# Altium footprint library Cty1.PcbLib: 1378 footprints (part 82 of 87)
Each footprint in its own frame and in the unit in brackets; x right, y up, seen from the top. Pads: shape width x height; smd on the part's side, far side on the other; paste and mask are expansions set on the pad; w line width, h text height; cw(c..) or ccw(c..) is an arc to the next point about the centre after c.
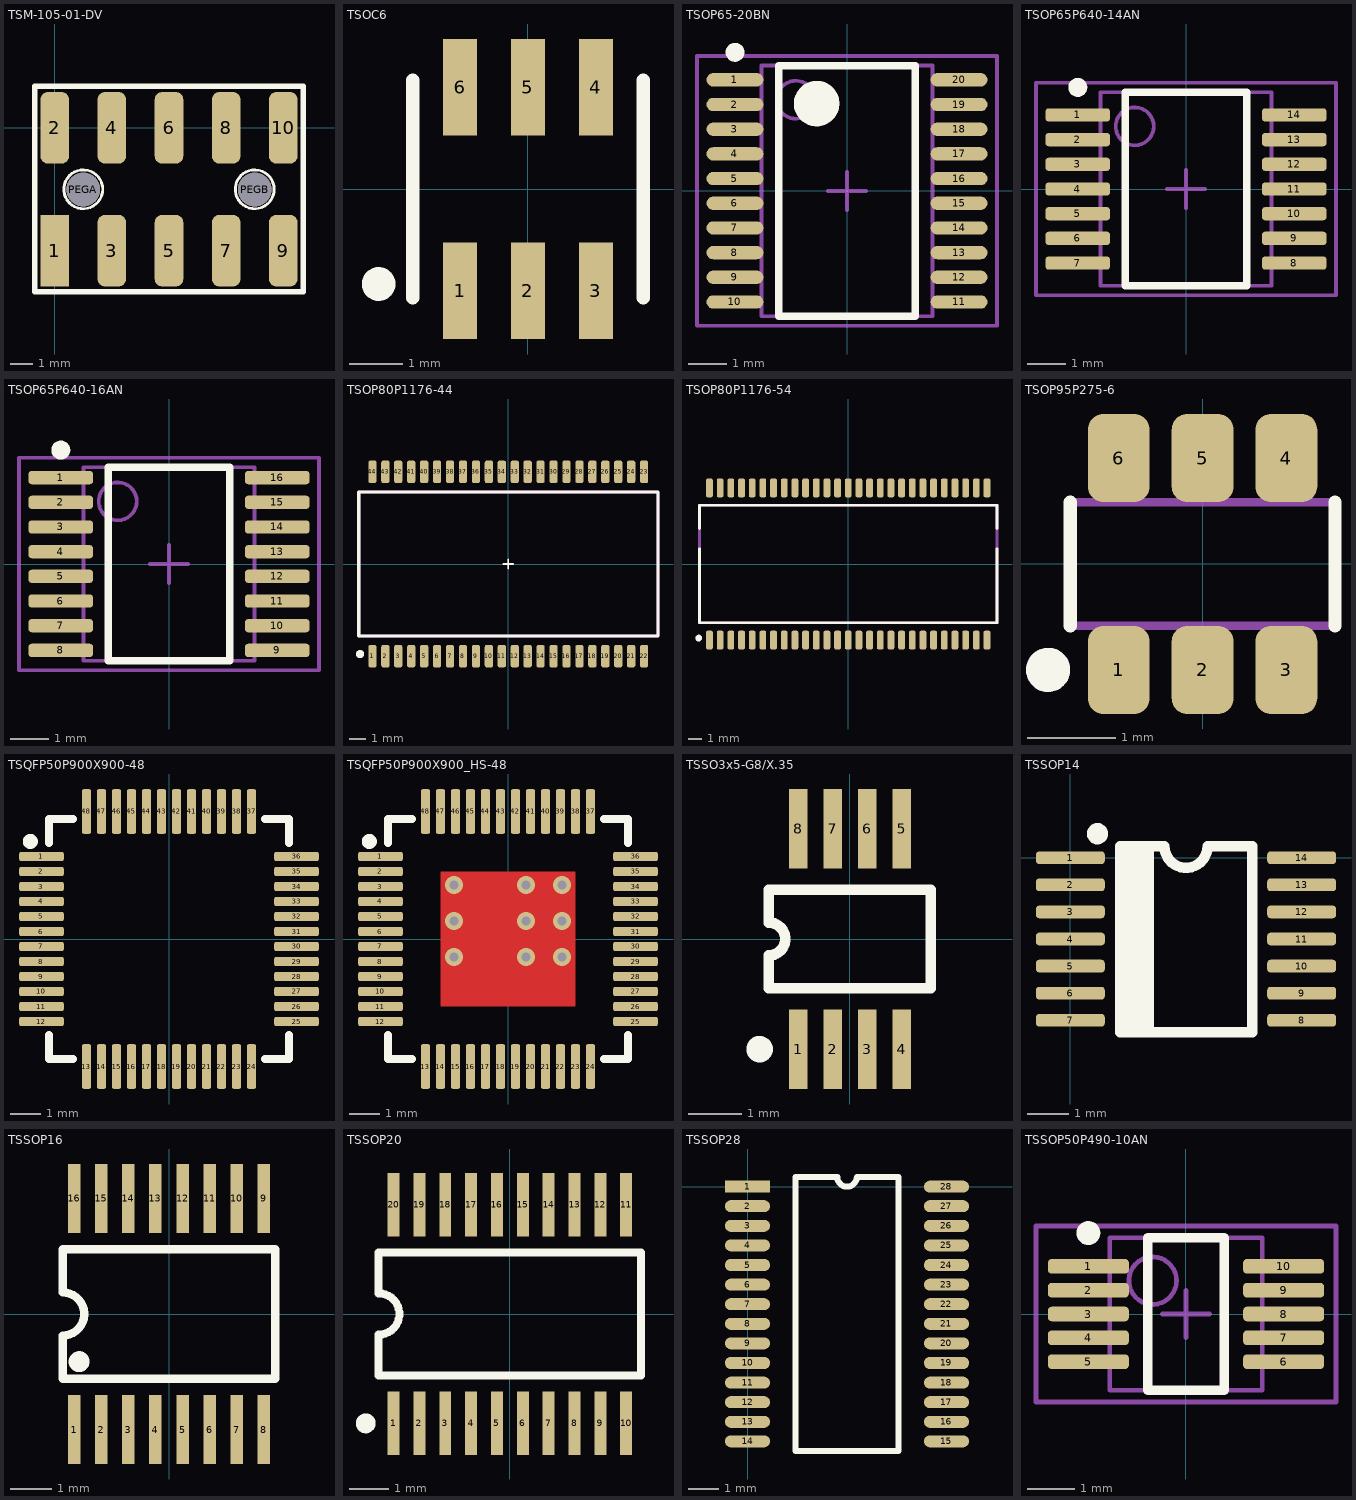
[diagram p81: the footprints below, top view; thin cyan lines are the x and y axes]

## TSM-105-01-DV [mil]
pads (12):
  rect 50x125 smd: 1(0,-215)
  rrect50% 50x125 smd: 2(0,0) 3(100,-215) 4(100,0) 5(200,-215) 6(200,0) 7(300,-215) 8(300,0) 9(400,-215) 10(400,0)
  round 59.05 hole 59.06 unplated mask+1.5: PEGA(50,-108) PEGB(350,-108)
Top Overlay:
  circle w5: c350,-107.52 r34.06
  circle w5: c50,-107.52 r34.06
  lines w10: -35,-287 -35,73 435,73 435,-287 -35,-287
3D body "TSM-105-01-X-DV-A.STEP": height 10, standoff 0, extent -52.1,-253.2 447.9,36.8

## TSOC6 [mil]
pads (6):
  rect 25x71 smd mask+1.5: 1(-50,-75) 2(0,-75) 3(50,-75) 4(50,75) 5(0,75) 6(-50,75)
Top Overlay:
  circle w15: c-110,-70 r4.92
  lines w10: -85,-80 -85,80 ; 85,-80 85,80
3D body: height 19.68, standoff 0, extent -61.81,-88.29 -37.83,-34.19
3D body: height 19.68, standoff 0, extent -11.81,-88.07 12.17,-33.98
3D body: height 19.68, standoff 0, extent 38.58,-89.57 62.56,-35.47
3D body: height 19.68, standoff 0, extent -62.95,35.47 -38.98,89.57
3D body: height 19.68, standoff 0, extent -12.17,36.93 11.81,91.02
3D body: height 19.68, standoff 0, extent 37.05,36.93 61.02,91.02
3D body: height 39.37, standoff 0, extent -79.43,-64.96 83.84,72.83
3D body: height 40, standoff 0, extent -62.54,-34.61 -40.14,-12.2

## TSOP65-20BN [mm] "TSOP, 20-Leads, Body 6.5x4.4mm, Pitch 0.65mm, IPC Medium Density"
height 1.2
pads (20):
  oval 1.5x0.35 smd: 1(-2.95,2.925) 2(-2.95,2.275) 3(-2.95,1.625) 4(-2.95,0.975) 5(-2.95,0.325) 6(-2.95,-0.325) 7(-2.95,-0.975) 8(-2.95,-1.625) 9(-2.95,-2.275) 10(-2.95,-2.925) 11(2.95,-2.925) 12(2.95,-2.275) 13(2.95,-1.625) 14(2.95,-0.975) 15(2.95,-0.325) 16(2.95,0.325) 17(2.95,0.975) 18(2.95,1.625) 19(2.95,2.275) 20(2.95,2.925)
Top Overlay:
  circle w0.25: c-2.95,3.65 r0.125
  circle w0.6: c-0.8,2.3 r0.3
  lines w0.2: -1.8,-3.3 -1.8,3.3 1.8,3.3 1.8,-3.3 -1.8,-3.3
Mechanical 13:
  circle w0.1: c-1.35,2.4 r0.5
  lines w0.1: -2.25,-3.3 -2.25,3.3 2.25,3.3 2.25,-3.3 -2.25,-3.3
Mechanical 15:
  lines w0.1: -0.5,0 0.5,0 ; 0,-0.5 0,0.5 ; -3.95,-3.55 -3.95,3.55 3.95,3.55 3.95,-3.55 -3.95,-3.55
3D body: height 1.2, standoff 0, extent -2.25,-3.3 2.25,3.3

## TSOP65P640-14AN [mm]
pads (14):
  rrect50% 1.7x0.35 smd: 1(-2.85,1.95) 2(-2.85,1.3) 3(-2.85,0.65) 4(-2.85,0) 5(-2.85,-0.65) 6(-2.85,-1.3) 7(-2.85,-1.95) 8(2.85,-1.95) 9(2.85,-1.3) 10(2.85,-0.65) 11(2.85,0) 12(2.85,0.65) 13(2.85,1.3) 14(2.85,1.95)
Top Overlay:
  circle w0.25: c-2.85,2.675 r0.125
  lines w0.2: -1.6,-2.55 1.6,-2.55 1.6,2.55 -1.6,2.55 -1.6,-2.55
Mechanical 13:
  circle w0.1: c-1.35,1.65 r0.5
  lines w0.1: -2.25,-2.55 -2.25,2.55 2.25,2.55 2.25,-2.55 -2.25,-2.55
Mechanical 15:
  lines w0.1: -0.5,0 0.5,0 ; 0,-0.5 0,0.5 ; -3.95,-2.8 -3.95,2.8 3.95,2.8 3.95,-2.8 -3.95,-2.8
3D body: height 0.64, standoff 0, extent -2.062,-2.535 1.925,2.469
3D body: height 0.13, standoff 0, extent 2.657,1.865 3.343,2.042
3D body: height 0.25, standoff 0.13, extent 1.984,1.865 2.721,2.042
3D body: height 0.13, standoff 0, extent 2.632,1.204 3.318,1.382
3D body: height 0.25, standoff 0.13, extent 1.959,1.204 2.696,1.382
3D body: height 0.13, standoff 0, extent 2.632,0.544 3.318,0.722
3D body: height 0.25, standoff 0.13, extent 1.934,0.544 2.67,0.722
3D body: height 0.13, standoff 0, extent 2.607,-0.091 3.292,0.087
3D body: height 0.25, standoff 0.13, extent 1.934,-0.091 2.67,0.087
3D body: height 0.25, standoff 0.13, extent 1.934,-0.701 2.67,-0.523
3D body: height 0.13, standoff 0, extent 2.607,-0.701 3.292,-0.523
3D body: height 0.25, standoff 0.13, extent 1.883,-1.336 2.619,-1.158
3D body: height 0.13, standoff 0, extent 2.556,-1.336 3.242,-1.158
3D body: height 0.25, standoff 0.13, extent 1.908,-1.971 2.645,-1.793
3D body: height 0.13, standoff 0, extent 2.581,-1.971 3.267,-1.793
3D body: height 0.25, standoff 0.13, extent -2.38,1.847 -1.643,2.024
3D body: height 0.13, standoff 0, extent -3.002,1.847 -2.316,2.024
3D body: height 0.25, standoff 0.13, extent -2.38,1.212 -1.643,1.389
3D body: height 0.13, standoff 0, extent -3.002,1.212 -2.316,1.389
3D body: height 0.25, standoff 0.13, extent -2.431,0.551 -1.694,0.729
3D body: height 0.13, standoff 0, extent -3.053,0.551 -2.367,0.729
3D body: height 0.25, standoff 0.13, extent -2.431,-0.084 -1.694,0.094
3D body: height 0.13, standoff 0, extent -3.053,-0.084 -2.367,0.094
3D body: height 0.25, standoff 0.13, extent -2.431,-0.719 -1.694,-0.541
3D body: height 0.13, standoff 0, extent -3.053,-0.719 -2.367,-0.541
3D body: height 0.25, standoff 0.13, extent -2.431,-1.354 -1.694,-1.176
3D body: height 0.13, standoff 0, extent -3.053,-1.354 -2.367,-1.176
3D body: height 0.25, standoff 0.13, extent -2.431,-2.014 -1.694,-1.836
3D body: height 0.13, standoff 0, extent -3.053,-2.014 -2.367,-1.836

## TSOP65P640-16AN [mm]
pads (16):
  rrect50% 1.7x0.35 smd: 1(-2.85,2.275) 2(-2.85,1.625) 3(-2.85,0.975) 4(-2.85,0.325) 5(-2.85,-0.325) 6(-2.85,-0.975) 7(-2.85,-1.625) 8(-2.85,-2.275) 9(2.85,-2.275) 10(2.85,-1.625) 11(2.85,-0.975) 12(2.85,-0.325) 13(2.85,0.325) 14(2.85,0.975) 15(2.85,1.625) 16(2.85,2.275)
Top Overlay:
  circle w0.25: c-2.85,3 r0.125
  lines w0.2: -1.6,-2.55 1.6,-2.55 1.6,2.55 -1.6,2.55 -1.6,-2.55
Mechanical 13:
  circle w0.1: c-1.35,1.65 r0.5
  lines w0.1: -2.25,-2.55 2.25,-2.55 2.25,2.55 -2.25,2.55 -2.25,-2.55
Mechanical 15:
  lines w0.1: -0.5,0 0.5,0 ; 0,-0.5 0,0.5 ; -3.95,-2.8 3.95,-2.8 3.95,2.8 -3.95,2.8 -3.95,-2.8
3D body: height 0.25, standoff 0.13, extent 1.934,-2.377 2.67,-2.199
3D body: height 0.13, standoff 0, extent 2.607,-2.377 3.292,-2.199
3D body: height 0.25, standoff 0.13, extent 1.959,-1.717 2.696,-1.539
3D body: height 0.13, standoff 0, extent 2.632,-1.717 3.318,-1.539
3D body: height 0.64, standoff 0, extent -2.037,-2.23 1.951,2.774
3D body: height 0.13, standoff 0, extent 2.683,2.169 3.369,2.347
3D body: height 0.25, standoff 0.13, extent 2.01,2.169 2.746,2.347
3D body: height 0.13, standoff 0, extent 2.657,1.509 3.343,1.687
3D body: height 0.25, standoff 0.13, extent 1.984,1.509 2.721,1.687
3D body: height 0.13, standoff 0, extent 2.657,0.849 3.343,1.026
3D body: height 0.25, standoff 0.13, extent 1.959,0.849 2.696,1.026
3D body: height 0.13, standoff 0, extent 2.632,0.214 3.318,0.391
3D body: height 0.25, standoff 0.13, extent 1.959,0.214 2.696,0.391
3D body: height 0.25, standoff 0.13, extent 1.959,-0.396 2.696,-0.218
3D body: height 0.13, standoff 0, extent 2.632,-0.396 3.318,-0.218
3D body: height 0.25, standoff 0.13, extent 1.908,-1.031 2.645,-0.853
3D body: height 0.13, standoff 0, extent 2.581,-1.031 3.267,-0.853
3D body: height 0.25, standoff 0.13, extent 1.934,-1.666 2.67,-1.488
3D body: height 0.13, standoff 0, extent 2.607,-1.666 3.292,-1.488
3D body: height 0.13, standoff 0, extent -3.226,1.473 -2.54,1.651
3D body: height 0.25, standoff 0.13, extent -2.603,1.473 -1.867,1.651
3D body: height 0.13, standoff 0, extent -3.2,0.838 -2.515,1.016
3D body: height 0.25, standoff 0.13, extent -2.578,0.838 -1.841,1.016
3D body: height 0.13, standoff 0, extent -3.251,0.203 -2.565,0.381
3D body: height 0.25, standoff 0.13, extent -2.629,0.203 -1.892,0.381
3D body: height 0.25, standoff 0.13, extent -2.629,-0.406 -1.892,-0.229
3D body: height 0.13, standoff 0, extent -3.251,-0.406 -2.565,-0.229
3D body: height 0.25, standoff 0.13, extent -2.629,-1.041 -1.892,-0.864
3D body: height 0.13, standoff 0, extent -3.277,-1.041 -2.591,-0.864
3D body: height 0.25, standoff 0.13, extent -2.654,-1.702 -1.918,-1.524
3D body: height 0.13, standoff 0, extent -3.277,-1.702 -2.591,-1.524
3D body: height 0.25, standoff 0.13, extent -2.68,-2.362 -1.943,-2.184
3D body: height 0.13, standoff 0, extent -3.302,-2.362 -2.616,-2.184
3D body: height 0.13, standoff 0, extent -3.251,1.524 -2.565,1.702
3D body: height 0.25, standoff 0.13, extent -2.629,1.524 -1.892,1.702
3D body: height 0.13, standoff 0, extent -3.226,2.184 -2.54,2.362
3D body: height 0.25, standoff 0.13, extent -2.603,2.184 -1.867,2.362

## TSOP80P1176-44 [mm]
pads (44):
  rrect50% 0.508x1.4 smd: 1(-8.4,-5.7) 2(-7.6,-5.7) 3(-6.8,-5.7) 4(-6,-5.7) 5(-5.2,-5.7) 6(-4.4,-5.7) 7(-3.6,-5.7) 8(-2.8,-5.7) 9(-2,-5.7) 10(-1.2,-5.7) 11(-0.4,-5.7) 12(0.4,-5.7) 13(1.2,-5.7) 14(2,-5.7) 15(2.8,-5.7) 16(3.6,-5.7) 17(4.4,-5.7) 18(5.2,-5.7) 19(6,-5.7) 20(6.8,-5.7) 21(7.6,-5.7) 22(8.4,-5.7) 23(8.4,5.7) 24(7.6,5.7) 25(6.8,5.7) 26(6,5.7) 27(5.2,5.7) 28(4.4,5.7) 29(3.6,5.7) 30(2.8,5.7) 31(2,5.7) 32(1.2,5.7) 33(0.4,5.7) 34(-0.4,5.7) 35(-1.2,5.7) 36(-2,5.7) 37(-2.8,5.7) 38(-3.6,5.7) 39(-4.4,5.7) 40(-5.2,5.7) 41(-6,5.7) 42(-6.8,5.7) 43(-7.6,5.7) 44(-8.4,5.7)
Top Overlay:
  circle w0.25: c-9.166,-5.577 r0.125
  lines w0.1: -0.3,0 0.3,0 ; 0,-0.3 0,0.3
  lines w0.2: -9.241,-4.452 9.259,-4.452 9.259,4.448 -9.241,4.448 -9.241,-0.637 -9.241,-4.452
Mechanical 7:
  circle w0.25: c-9.166,-5.577 r0.125
  lines w0.1: -0.3,0 0.3,0 ; 0,-0.3 0,0.3
  lines w0.2: -9.241,-4.452 -9.241,-0.637 -9.241,4.448 9.259,4.448 9.259,-4.452 -9.241,-4.452
  text ".Comment" at -8.813,2.33 h1.2
  text ".Designator" at -8.813,3.33 h1.2
3D body: height 0.3, standoff 0, extent -8.731,-5.936 -8.118,-4.493
3D body: height 0.3, standoff 0, extent -7.888,-5.947 -7.274,-4.504
3D body: height 0.3, standoff 0, extent -7.134,-5.925 -6.52,-4.482
3D body: height 0.3, standoff 0, extent -6.337,-5.925 -5.723,-4.482
3D body: height 0.3, standoff 0, extent -5.518,-5.947 -4.905,-4.504
3D body: height 0.3, standoff 0, extent -4.743,-5.947 -4.129,-4.504
3D body: height 0.3, standoff 0, extent -3.924,-5.947 -3.311,-4.504
3D body: height 0.3, standoff 0, extent -3.148,-5.947 -2.535,-4.504
3D body: height 0.3, standoff 0, extent -2.351,-5.947 -1.738,-4.504
3D body: height 0.3, standoff 0, extent -1.511,-5.947 -0.898,-4.504
3D body: height 0.3, standoff 0, extent -0.714,-5.947 -0.101,-4.504
3D body: height 0.3, standoff 0, extent 0.061,-5.947 0.675,-4.504
3D body: height 0.3, standoff 0, extent 0.902,-5.947 1.515,-4.504
3D body: height 0.3, standoff 0, extent 1.677,-5.925 2.29,-4.482
3D body: height 0.3, standoff 0, extent 2.453,-5.925 3.066,-4.482
3D body: height 0.3, standoff 0, extent 3.293,-5.925 3.906,-4.482
3D body: height 0.3, standoff 0, extent 4.09,-5.925 4.703,-4.482
3D body: height 0.3, standoff 0, extent 4.887,-5.925 5.5,-4.482
3D body: height 0.3, standoff 0, extent 5.684,-5.904 6.297,-4.461
3D body: height 0.3, standoff 0, extent 6.438,-5.904 7.051,-4.461
3D body: height 0.3, standoff 0, extent 7.257,-5.882 7.87,-4.439
3D body: height 0.3, standoff 0, extent 8.075,-5.904 8.688,-4.461
3D body: height 0.3, standoff 0, extent 8.14,4.372 8.753,5.815
3D body: height 0.3, standoff 0, extent 7.321,4.393 7.934,5.836
3D body: height 0.3, standoff 0, extent 6.503,4.372 7.116,5.815
3D body: height 0.3, standoff 0, extent 5.749,4.372 6.362,5.815
3D body: height 0.3, standoff 0, extent 4.951,4.35 5.565,5.793
3D body: height 0.3, standoff 0, extent 4.154,4.35 4.768,5.793
3D body: height 0.3, standoff 0, extent 3.357,4.35 3.971,5.793
3D body: height 0.3, standoff 0, extent 2.517,4.35 3.13,5.793
3D body: height 0.3, standoff 0, extent 1.742,4.35 2.355,5.793
3D body: height 0.3, standoff 0, extent 0.966,4.329 1.579,5.772
3D body: height 0.3, standoff 0, extent 0.126,4.329 0.739,5.772
3D body: height 0.3, standoff 0, extent -0.649,4.329 -0.036,5.772
3D body: height 0.3, standoff 0, extent -1.447,4.329 -0.833,5.772
3D body: height 0.3, standoff 0, extent -2.287,4.329 -1.673,5.772
3D body: height 0.3, standoff 0, extent -3.084,4.329 -2.47,5.772
3D body: height 0.3, standoff 0, extent -3.859,4.329 -3.246,5.772
3D body: height 0.3, standoff 0, extent -4.678,4.329 -4.065,5.772
3D body: height 0.3, standoff 0, extent -5.453,4.329 -4.84,5.772
3D body: height 0.3, standoff 0, extent -6.272,4.35 -5.659,5.793
3D body: height 0.3, standoff 0, extent -7.069,4.35 -6.456,5.793
3D body: height 0.3, standoff 0, extent -7.823,4.329 -7.21,5.772
3D body: height 0.3, standoff 0, extent -8.666,4.34 -8.053,5.783
3D body: height 1, standoff 0, extent -9.244,-4.542 9.262,4.404

## TSOP80P1176-54 [mm]
pads (54):
  rrect50% 0.508x1.4 smd: 1(-10.4,-5.7) 2(-9.6,-5.7) 3(-8.8,-5.7) 4(-8,-5.7) 5(-7.2,-5.7) 6(-6.4,-5.7) 7(-5.6,-5.7) 8(-4.8,-5.7) 9(-4,-5.7) 10(-3.2,-5.7) 11(-2.4,-5.7) 12(-1.6,-5.7) 13(-0.8,-5.7) 14(0,-5.7) 15(0.8,-5.7) 16(1.6,-5.7) 17(2.4,-5.7) 18(3.2,-5.7) 19(4,-5.7) 20(4.8,-5.7) 21(5.6,-5.7) 22(6.4,-5.7) 23(7.2,-5.7) 24(8,-5.7) 25(8.8,-5.7) 26(9.6,-5.7) 27(10.4,-5.7) 28(10.4,5.7) 29(9.6,5.7) 30(8.8,5.7) 31(8,5.7) 32(7.2,5.7) 33(6.4,5.7) 34(5.6,5.7) 35(4.8,5.7) 36(4,5.7) 37(3.2,5.7) 38(2.4,5.7) 39(1.6,5.7) 40(0.8,5.7) 41(0,5.7) 42(-0.8,5.7) 43(-1.6,5.7) 44(-2.4,5.7) 45(-3.2,5.7) 46(-4,5.7) 47(-4.8,5.7) 48(-5.6,5.7) 49(-6.4,5.7) 50(-7.2,5.7) 51(-8,5.7) 52(-8.8,5.7) 53(-9.6,5.7) 54(-10.4,5.7)
Top Overlay:
  circle w0.25: c-11.21,-5.55 r0.125
  lines w0.2: -11.15,1.147 -11.15,-0.635 -11.15,-4.4 11.15,-4.4 11.15,1.147 ; -11.15,2.658 -11.15,4.4 11.15,4.4 11.15,2.658
Mechanical 7:
  circle w0.25: c-11.21,-5.55 r0.125
  lines w0.2: -11.15,-4.4 11.15,-4.4 11.15,4.4 -11.15,4.4 -11.15,-0.635 -11.15,-4.4
  text ".Comment" at -10.591,2.076 h1.2
  text ".Designator" at -10.591,3.076 h1.2
3D body: height 0.3, standoff 0, extent -6.684,-5.95 -6.071,-4.507
3D body: height 0.3, standoff 0, extent -5.841,-5.961 -5.228,-4.518
3D body: height 0.3, standoff 0, extent -5.087,-5.939 -4.474,-4.497
3D body: height 0.3, standoff 0, extent -4.29,-5.939 -3.677,-4.497
3D body: height 0.3, standoff 0, extent -3.471,-5.961 -2.858,-4.518
3D body: height 0.3, standoff 0, extent -2.696,-5.961 -2.082,-4.518
3D body: height 0.3, standoff 0, extent -1.877,-5.961 -1.264,-4.518
3D body: height 0.3, standoff 0, extent -1.102,-5.961 -0.488,-4.518
3D body: height 0.3, standoff 0, extent -0.305,-5.961 0.309,-4.518
3D body: height 0.3, standoff 0, extent 0.536,-5.961 1.149,-4.518
3D body: height 0.3, standoff 0, extent 1.333,-5.961 1.946,-4.518
3D body: height 0.3, standoff 0, extent 2.108,-5.961 2.721,-4.518
3D body: height 0.3, standoff 0, extent 2.948,-5.961 3.562,-4.518
3D body: height 0.3, standoff 0, extent 3.724,-5.939 4.337,-4.497
3D body: height 0.3, standoff 0, extent 4.499,-5.939 5.113,-4.497
3D body: height 0.3, standoff 0, extent 5.339,-5.939 5.953,-4.497
3D body: height 0.3, standoff 0, extent 6.137,-5.939 6.75,-4.497
3D body: height 0.3, standoff 0, extent 6.934,-5.939 7.547,-4.497
3D body: height 0.3, standoff 0, extent 7.731,-5.918 8.344,-4.475
3D body: height 0.3, standoff 0, extent 8.485,-5.918 9.098,-4.475
3D body: height 0.3, standoff 0, extent 9.303,-5.896 9.917,-4.453
3D body: height 0.3, standoff 0, extent 10.122,-5.918 10.735,-4.475
3D body: height 0.3, standoff 0, extent -6.684,4.47 -6.071,5.913
3D body: height 0.3, standoff 0, extent -5.841,4.459 -5.228,5.902
3D body: height 0.3, standoff 0, extent -5.087,4.48 -4.474,5.923
3D body: height 0.3, standoff 0, extent -4.29,4.48 -3.677,5.923
3D body: height 0.3, standoff 0, extent -3.471,4.459 -2.858,5.902
3D body: height 0.3, standoff 0, extent -2.696,4.459 -2.082,5.902
3D body: height 0.3, standoff 0, extent -1.877,4.459 -1.264,5.902
3D body: height 0.3, standoff 0, extent -1.102,4.459 -0.488,5.902
3D body: height 0.3, standoff 0, extent -0.305,4.459 0.309,5.902
3D body: height 0.3, standoff 0, extent 0.536,4.459 1.149,5.902
3D body: height 0.3, standoff 0, extent 1.333,4.459 1.946,5.902
3D body: height 0.3, standoff 0, extent 2.108,4.459 2.721,5.902
3D body: height 0.3, standoff 0, extent 2.948,4.459 3.562,5.902
3D body: height 0.3, standoff 0, extent 3.724,4.48 4.337,5.923
3D body: height 0.3, standoff 0, extent 4.499,4.48 5.113,5.923
3D body: height 0.3, standoff 0, extent 5.339,4.48 5.953,5.923
3D body: height 0.3, standoff 0, extent 6.137,4.48 6.75,5.923
3D body: height 0.3, standoff 0, extent 6.934,4.48 7.547,5.923
3D body: height 0.3, standoff 0, extent 7.731,4.502 8.344,5.945
3D body: height 0.3, standoff 0, extent 8.485,4.502 9.098,5.945
3D body: height 0.3, standoff 0, extent 9.303,4.523 9.917,5.966
3D body: height 0.3, standoff 0, extent 10.122,4.502 10.735,5.945
3D body: height 0.3, standoff 0, extent -10.742,4.487 -10.129,5.93
3D body: height 0.3, standoff 0, extent -9.899,4.476 -9.286,5.919
3D body: height 0.3, standoff 0, extent -9.145,4.497 -8.532,5.94
3D body: height 0.3, standoff 0, extent -8.348,4.497 -7.735,5.94
3D body: height 0.3, standoff 0, extent -7.529,4.476 -6.916,5.919
3D body: height 0.3, standoff 0, extent -10.706,-5.944 -10.093,-4.501
3D body: height 0.3, standoff 0, extent -9.888,-5.944 -9.275,-4.501
3D body: height 0.3, standoff 0, extent -9.112,-5.944 -8.499,-4.501
3D body: height 0.3, standoff 0, extent -8.315,-5.944 -7.702,-4.501
3D body: height 0.3, standoff 0, extent -7.475,-5.944 -6.862,-4.501
3D body: height 1, standoff 0, extent -11.225,-4.447 11.192,4.447
3D body: height 0.5, standoff 0.4, extent -11.22,2.103 -10.52,3.328
3D body: height 0.5, standoff 0.4, extent 10.415,2.394 11.115,3.619

## TSOP95P275-6 [mm]
pads (6):
  rrect50% 0.7x1 smd: 1(-0.95,-1.2) 2(0,-1.2) 3(0.95,-1.2) 4(0.95,1.2) 5(0,1.2) 6(-0.95,1.2)
Top Overlay:
  circle w0.25: c-1.75,-1.2 r0.125
  lines w0.15: -1.5,-0.7 -1.5,0.7 ; 1.5,-0.7 1.5,0.7
Mechanical 7:
  circle w0.25: c-1.75,-1.2 r0.125
  region: -0.897,-0.724 -1.097,-0.724 -1.097,-1.324 -0.897,-1.324
  region: 0.124,-0.701 -0.076,-0.701 -0.076,-1.301 0.124,-1.301
  region: 1.103,-0.724 0.903,-0.724 0.903,-1.324 1.103,-1.324
  rectangle: 0.877,0.7 1.077,1.3
  rectangle: -0.097,0.676 0.103,1.276
  rectangle: -1.123,0.7 -0.923,1.3
  lines w0.1: -1.5,-0.7 -1.5,0.7 1.5,0.7 1.5,-0.7 -1.5,-0.7
  text ".Designator" at -1.4,0.2 h0.5
  text ".Comment" at -1.4,-0.3 h0.5
3D body: height 0.8, standoff 0, extent -1.49,-0.701 1.508,0.698
3D body: height 0.3, standoff 0, extent -1.094,-1.301 -0.871,-0.702
3D body: height 0.3, standoff 0, extent -0.101,-1.304 0.122,-0.704
3D body: height 0.3, standoff 0, extent 0.905,-1.304 1.128,-0.704
3D body: height 0.3, standoff 0, extent -1.103,0.691 -0.88,1.291
3D body: height 0.3, standoff 0, extent -0.119,0.696 0.104,1.295
3D body: height 0.3, standoff 0, extent 0.888,0.687 1.111,1.286

## TSQFP50P900X900-48 [mm]
pads (48):
  rrect50% 1.5x0.305 smd: 1(-4.25,2.75) 2(-4.25,2.25) 3(-4.25,1.75) 4(-4.25,1.25) 5(-4.25,0.75) 6(-4.25,0.25) 7(-4.25,-0.25) 8(-4.25,-0.75) 9(-4.25,-1.25) 10(-4.25,-1.75) 11(-4.25,-2.25) 12(-4.25,-2.75) 25(4.25,-2.75) 26(4.25,-2.25) 27(4.25,-1.75) 28(4.25,-1.25) 29(4.25,-0.75) 30(4.25,-0.25) 31(4.25,0.25) 32(4.25,0.75) 33(4.25,1.25) 34(4.25,1.75) 35(4.25,2.25) 36(4.25,2.75)
  rrect50% 0.305x1.5 smd: 13(-2.75,-4.25) 14(-2.25,-4.25) 15(-1.75,-4.25) 16(-1.25,-4.25) 17(-0.75,-4.25) 18(-0.25,-4.25) 19(0.25,-4.25) 20(0.75,-4.25) 21(1.25,-4.25) 22(1.75,-4.25) 23(2.25,-4.25) 24(2.75,-4.25) 37(2.75,4.25) 38(2.25,4.25) 39(1.75,4.25) 40(1.25,4.25) 41(0.75,4.25) 42(0.25,4.25) 43(-0.25,4.25) 44(-0.75,4.25) 45(-1.25,4.25) 46(-1.75,4.25) 47(-2.25,4.25) 48(-2.75,4.25)
Top Overlay:
  circle w0.25: c-4.621,3.251 r0.125
  lines w0.254: -4,-3.2 -4,-4 -3.2,-4 ; -4,3.2 -4,4 -3.2,4 ; 3.2,-4 4,-4 4,-3.2 ; 3.2,4 4,4 4,3.2
3D body: height 0.85, standoff 0.05, extent -2.597,1.889 -1.866,2.62
3D body: height 0.3, standoff 0.1, extent 0.633,3.143 0.856,4.187
3D body: height 0.3, standoff 0.1, extent 2.941,1.624 3.984,1.847
3D body: height 0.3, standoff 0.1, extent 2.966,-0.357 4.01,-0.134
3D body: height 0.3, standoff 0.1, extent 2.963,-2.364 4.007,-2.141
3D body: height 0.3, standoff 0.1, extent 2.94,-2.833 3.983,-2.61
3D body: height 0.3, standoff 0.1, extent 1.653,-4.112 1.877,-3.069
3D body: height 0.3, standoff 0.1, extent -0.343,-4.076 -0.12,-3.033
3D body: height 0.3, standoff 0.1, extent -2.848,-4.135 -2.625,-3.092
3D body: height 0.3, standoff 0.1, extent -2.349,-4.115 -2.126,-3.071
3D body: height 0.3, standoff 0.1, extent -3.999,1.098 -2.956,1.321
3D body: height 0.3, standoff 0.1, extent -3.973,-2.869 -2.93,-2.646
3D body: height 0.3, standoff 0.1, extent -4.003,-2.361 -2.959,-2.138
3D body: height 0.3, standoff 0.1, extent -4.007,-1.37 -2.957,-1.146
3D body: height 0.3, standoff 0.1, extent -4.006,-1.873 -2.962,-1.65
3D body: height 0.3, standoff 0.1, extent -4.007,0.605 -2.956,0.828
3D body: height 0.3, standoff 0.1, extent -4.025,0.107 -2.981,0.33
3D body: height 0.3, standoff 0.1, extent -4.025,-0.401 -2.981,-0.178
3D body: height 0.8, standoff 0, extent -3.26,-3.298 3.039,3.226
3D body: height 0.3, standoff 0.1, extent -3.998,1.628 -2.954,1.851
3D body: height 0.3, standoff 0.1, extent -4.015,2.117 -2.971,2.34
3D body: height 0.3, standoff 0.1, extent -4.007,2.625 -2.956,2.848
3D body: height 0.3, standoff 0.1, extent 2.93,-1.862 3.981,-1.638
3D body: height 0.3, standoff 0.1, extent 2.931,-1.346 3.974,-1.123
3D body: height 0.3, standoff 0.1, extent 2.931,-0.864 3.974,-0.64
3D body: height 0.3, standoff 0.1, extent 2.931,1.143 3.974,1.366
3D body: height 0.3, standoff 0.1, extent 2.956,0.635 3.999,0.858
3D body: height 0.3, standoff 0.1, extent 2.934,0.139 3.985,0.362
3D body: height 0.3, standoff 0.1, extent 2.931,2.637 3.974,2.86
3D body: height 0.3, standoff 0.1, extent 2.93,2.114 3.981,2.337
3D body: height 0.3, standoff 0.1, extent 1.637,3.161 1.86,4.212
3D body: height 0.3, standoff 0.1, extent 1.147,3.176 1.37,4.219
3D body: height 0.3, standoff 0.1, extent 0.155,3.149 0.378,4.192
3D body: height 0.3, standoff 0.1, extent -1.36,3.176 -1.137,4.219
3D body: height 0.3, standoff 0.1, extent -0.85,3.149 -0.626,4.192
3D body: height 0.3, standoff 0.1, extent -0.342,3.178 -0.118,4.229
3D body: height 0.3, standoff 0.1, extent -2.873,3.198 -2.65,4.242
3D body: height 0.3, standoff 0.1, extent -2.373,3.181 -2.15,4.232
3D body: height 0.3, standoff 0.1, extent -1.855,-4.113 -1.632,-3.063
3D body: height 0.3, standoff 0.1, extent -1.344,-4.076 -1.121,-3.033
3D body: height 0.3, standoff 0.1, extent -0.834,-4.088 -0.61,-3.044
3D body: height 0.3, standoff 0.1, extent 1.181,-4.115 1.404,-3.071
3D body: height 0.3, standoff 0.1, extent 0.679,-4.076 0.902,-3.033
3D body: height 0.3, standoff 0.1, extent 0.159,-4.11 0.382,-3.06
3D body: height 0.3, standoff 0.1, extent 2.655,-4.112 2.878,-3.069
3D body: height 0.3, standoff 0.1, extent 2.155,-4.116 2.379,-3.066
3D body: height 0.3, standoff 0.1, extent 2.151,3.14 2.374,4.191
3D body: height 0.3, standoff 0.1, extent 2.642,3.146 2.865,4.189
3D body: height 0.3, standoff 0.1, extent -1.825,3.154 -1.602,4.205
3D body: height 0.3, standoff 0.1, extent -4.044,-0.84 -3.001,-0.617

## TSQFP50P900X900_HS-48 [mm]
pads (48):
  rrect50% 1.5x0.305 smd: 1(-4.25,2.75) 2(-4.25,2.25) 3(-4.25,1.75) 4(-4.25,1.25) 5(-4.25,0.75) 6(-4.25,0.25) 7(-4.25,-0.25) 8(-4.25,-0.75) 9(-4.25,-1.25) 10(-4.25,-1.75) 11(-4.25,-2.25) 12(-4.25,-2.75) 25(4.25,-2.75) 26(4.25,-2.25) 27(4.25,-1.75) 28(4.25,-1.25) 29(4.25,-0.75) 30(4.25,-0.25) 31(4.25,0.25) 32(4.25,0.75) 33(4.25,1.25) 34(4.25,1.75) 35(4.25,2.25) 36(4.25,2.75)
  rrect50% 0.305x1.5 smd: 13(-2.75,-4.25) 14(-2.25,-4.25) 15(-1.75,-4.25) 16(-1.25,-4.25) 17(-0.75,-4.25) 18(-0.25,-4.25) 19(0.25,-4.25) 20(0.75,-4.25) 21(1.25,-4.25) 22(1.75,-4.25) 23(2.25,-4.25) 24(2.75,-4.25) 37(2.75,4.25) 38(2.25,4.25) 39(1.75,4.25) 40(1.25,4.25) 41(0.75,4.25) 42(0.25,4.25) 43(-0.25,4.25) 44(-0.75,4.25) 45(-1.25,4.25) 46(-1.75,4.25) 47(-2.25,4.25) 48(-2.75,4.25)
via 0.6,1.8 diameter 0.6 hole 0.3
via 1.8,1.8 diameter 0.6 hole 0.3
via -1.8,-0.6 diameter 0.6 hole 0.3
via 0.6,-0.6 diameter 0.6 hole 0.3
via 1.8,-0.6 diameter 0.6 hole 0.3
via -1.8,0.6 diameter 0.6 hole 0.3
via 0.6,0.6 diameter 0.6 hole 0.3
via 1.8,0.6 diameter 0.6 hole 0.3
via -1.8,1.8 diameter 0.6 hole 0.3
Top Layer:
  rectangle: -2.25,-2.25 2.25,2.25
Top Overlay:
  circle w0.25: c-4.621,3.251 r0.125
  lines w0.254: -4,-3.2 -4,-4 -3.2,-4 ; -4,3.2 -4,4 -3.2,4 ; 3.2,-4 4,-4 4,-3.2 ; 3.2,4 4,4 4,3.2
Top Paste:
  rectangle: -2.25,-2.25 2.25,2.25
Top Solder:
  rectangle: -2.25,-2.25 2.25,2.25
  rectangle: -2.35,-2.35 2.35,2.35
3D body: height 0.3, standoff 0, extent -4.069,-0.84 -3.026,-0.617
3D body: height 0.3, standoff 0, extent -1.851,3.154 -1.627,4.205
3D body: height 0.3, standoff 0, extent 2.616,3.146 2.839,4.189
3D body: height 0.3, standoff 0, extent 2.126,3.14 2.349,4.191
3D body: height 0.3, standoff 0, extent 2.13,-4.116 2.353,-3.066
3D body: height 0.3, standoff 0, extent 2.629,-4.112 2.852,-3.069
3D body: height 0.3, standoff 0, extent 0.133,-4.11 0.357,-3.06
3D body: height 0.3, standoff 0, extent 0.653,-4.076 0.876,-3.033
3D body: height 0.3, standoff 0, extent 1.155,-4.115 1.378,-3.071
3D body: height 0.3, standoff 0, extent -0.859,-4.088 -0.636,-3.044
3D body: height 0.3, standoff 0, extent -1.37,-4.076 -1.147,-3.033
3D body: height 0.3, standoff 0, extent -1.881,-4.113 -1.658,-3.063
3D body: height 0.3, standoff 0, extent -2.399,3.181 -2.176,4.232
3D body: height 0.3, standoff 0, extent -2.899,3.198 -2.676,4.242
3D body: height 0.3, standoff 0, extent -0.367,3.178 -0.144,4.229
3D body: height 0.3, standoff 0, extent -0.875,3.149 -0.652,4.192
3D body: height 0.3, standoff 0, extent -1.386,3.176 -1.163,4.219
3D body: height 0.3, standoff 0, extent 0.129,3.149 0.352,4.192
3D body: height 0.3, standoff 0, extent 1.122,3.176 1.345,4.219
3D body: height 0.3, standoff 0, extent 1.612,3.161 1.835,4.212
3D body: height 0.3, standoff 0, extent 2.905,2.114 3.956,2.337
3D body: height 0.3, standoff 0, extent 2.906,2.637 3.949,2.86
3D body: height 0.3, standoff 0, extent 2.909,0.139 3.959,0.362
3D body: height 0.3, standoff 0, extent 2.931,0.635 3.974,0.858
3D body: height 0.3, standoff 0, extent 2.905,1.143 3.948,1.366
3D body: height 0.3, standoff 0, extent 2.905,-0.864 3.948,-0.64
3D body: height 0.3, standoff 0, extent 2.905,-1.346 3.948,-1.123
3D body: height 0.3, standoff 0, extent 2.905,-1.862 3.956,-1.638
3D body: height 0.3, standoff 0, extent -4.032,2.625 -2.981,2.848
3D body: height 0.3, standoff 0, extent -4.04,2.117 -2.997,2.34
3D body: height 0.3, standoff 0, extent -4.023,1.628 -2.98,1.851
3D body: height 0.8, standoff 0, extent -3.285,-3.298 3.014,3.226
3D body: height 0.3, standoff 0, extent -4.05,-0.401 -3.007,-0.178
3D body: height 0.3, standoff 0, extent -4.05,0.107 -3.007,0.33
3D body: height 0.3, standoff 0, extent -4.032,0.605 -2.981,0.828
3D body: height 0.3, standoff 0, extent -4.031,-1.873 -2.988,-1.65
3D body: height 0.3, standoff 0, extent -4.033,-1.37 -2.982,-1.146
3D body: height 0.3, standoff 0, extent -4.028,-2.361 -2.985,-2.138
3D body: height 0.3, standoff 0, extent -3.999,-2.869 -2.956,-2.646
3D body: height 0.3, standoff 0, extent -4.025,1.098 -2.981,1.321
3D body: height 0.3, standoff 0, extent -2.374,-4.115 -2.151,-3.071
3D body: height 0.3, standoff 0, extent -2.873,-4.135 -2.65,-3.092
3D body: height 0.3, standoff 0, extent -0.369,-4.076 -0.146,-3.033
3D body: height 0.3, standoff 0, extent 1.628,-4.112 1.851,-3.069
3D body: height 0.3, standoff 0, extent 2.914,-2.833 3.958,-2.61
3D body: height 0.3, standoff 0, extent 2.938,-2.364 3.981,-2.141
3D body: height 0.3, standoff 0, extent 2.941,-0.357 3.984,-0.134
3D body: height 0.3, standoff 0, extent 2.916,1.624 3.959,1.847
3D body: height 0.3, standoff 0, extent 0.608,3.143 0.831,4.187

## TSSO3x5-G8/X.35 [mm]
pads (8):
  rect 0.35x1.5 smd: 1(-0.975,-2.075) 2(-0.325,-2.075) 3(0.325,-2.075) 4(0.975,-2.075) 5(0.975,2.075) 6(0.325,2.075) 7(-0.325,2.075) 8(-0.975,2.075)
Top Overlay:
  circle w0.25: c-1.7,-2.075 r0.125
  lines w0.2: -1.525,-0.925 1.525,-0.925 1.525,0.925 -1.525,0.925 -1.525,0.308 cw(c-1.525,0) -1.525,-0.308 -1.525,-0.925

## TSSOP14 [mm]
pads (14):
  rrect50% 1.65x0.305 smd: 1(0,0) 2(0,-0.65) 3(0,-1.3) 4(0,-1.95) 5(0,-2.6) 6(0,-3.25) 7(0,-3.9) 8(5.55,-3.9) 9(5.55,-3.25) 10(5.55,-2.6) 11(5.55,-1.95) 12(5.55,-1.3) 13(5.55,-0.65) 14(5.55,0)
Top Overlay:
  circle w0.254: c0.65,0.577 r0.127
  lines w0.25: 2.235,0.279 1.194,0.279 1.194,-4.191 4.369,-4.191 4.369,0.279 3.302,0.279 ; 2.258,0.275 ccw(c2.775,0.275) 3.292,0.275
  lines w0.254: 1.397,-4.14 1.397,0.229 ; 1.575,-4.14 1.575,0.254 ; 1.714,0.275 1.727,-4.14 ; 1.88,-4.14 1.88,0.279
3D body "TSSOP14.stp": height 1.19, standoff -0.01, extent -0.401,-4.491 5.999,0.609

## TSSOP16 [mm] "Shrink Small Outline; 16 Leads; Body Width 4.4 mm; Pitch 0.65 mm"
height 1.1
pads (16):
  rect 0.3x1.65 smd: 1(-2.275,-2.775) 2(-1.625,-2.775) 3(-0.975,-2.775) 4(-0.325,-2.775) 5(0.325,-2.775) 6(0.975,-2.775) 7(1.625,-2.775) 8(2.275,-2.775) 9(2.275,2.775) 10(1.625,2.775) 11(0.975,2.775) 12(0.325,2.775) 13(-0.325,2.775) 14(-0.975,2.775) 15(-1.625,2.775) 16(-2.275,2.775)
Top Overlay:
  circle w0.25: c-2.157,-1.143 r0.125
  lines w0.2: -2.55,-1.55 -2.55,-0.517 ccw(c-2.55,0) -2.55,0.517 -2.55,1.55 2.55,1.55 2.55,-1.55 -2.55,-1.55

## TSSOP20 [mm] "Shrink Small Outline; 20 Leads; Body Width 4.4 mm; Pitch 0.65 mm"
height 1.1
pads (20):
  rect 0.3x1.6 smd: 1(-2.925,-2.75) 2(-2.275,-2.75) 3(-1.625,-2.75) 4(-0.975,-2.75) 5(-0.325,-2.75) 6(0.325,-2.75) 7(0.975,-2.75) 8(1.625,-2.75) 9(2.275,-2.75) 10(2.925,-2.75) 11(2.925,2.75) 12(2.275,2.75) 13(1.625,2.75) 14(0.975,2.75) 15(0.325,2.75) 16(-0.325,2.75) 17(-0.975,2.75) 18(-1.625,2.75) 19(-2.275,2.75) 20(-2.925,2.75)
Top Overlay:
  circle w0.25: c-3.625,-2.75 r0.125
  lines w0.2: -3.3,-1.55 3.3,-1.55 3.3,1.55 -3.3,1.55 -3.3,0.52 cw(c-3.3,0) -3.3,-0.52 -3.3,-1.55

## TSSOP28 [mm]
pads (28):
  rect 1.5x0.4 smd: 1(0,0)
  oval 1.5x0.4 smd: 2(0,-0.65) 3(0,-1.3) 4(0,-1.95) 5(0,-2.6) 6(0,-3.25) 7(0,-3.9) 8(0,-4.55) 9(0,-5.2) 10(0,-5.85) 11(0,-6.5) 12(0,-7.15) 13(0,-7.8) 14(0,-8.45) 15(6.6,-8.45) 16(6.6,-7.8) 17(6.6,-7.15) 18(6.6,-6.5) 19(6.6,-5.85) 20(6.6,-5.2) 21(6.6,-4.55) 22(6.6,-3.9) 23(6.6,-3.25) 24(6.6,-2.6) 25(6.6,-1.95) 26(6.6,-1.3) 27(6.6,-0.65) 28(6.6,0)
Top Overlay:
  lines w0.2: 1.585,0.325 1.585,-8.775 5.015,-8.775 5.015,0.325 3.625,0.325 cw(c3.3,0.325) 2.975,0.325 ; 1.593,0.325 2.983,0.325

## TSSOP50P490-10AN [mm]
pads (10):
  rrect50% 1.7x0.305 smd: 1(-2.05,1) 2(-2.05,0.5) 3(-2.05,0) 4(-2.05,-0.5) 5(-2.05,-1) 6(2.05,-1) 7(2.05,-0.5) 8(2.05,0) 9(2.05,0.5) 10(2.05,1)
Top Overlay:
  circle w0.25: c-2.05,1.7 r0.125
  lines w0.2: -0.8,-1.6 -0.8,1.6 0.8,1.6 0.8,-1.6 -0.8,-1.6
Mechanical 13:
  circle w0.1: c-0.7,0.7 r0.5
  lines w0.1: -1.6,-1.6 -1.6,1.6 1.6,1.6 1.6,-1.6 -1.6,-1.6
Mechanical 15:
  lines w0.1: -0.5,0 0.5,0 ; 0,-0.5 0,0.5 ; -3.15,-1.85 -3.15,1.85 3.15,1.85 3.15,-1.85 -3.15,-1.85
3D body: height 0.13, standoff 0, extent 1.718,-1.082 2.403,-0.904
3D body: height 0.25, standoff 0.13, extent 1.045,-1.082 1.781,-0.904
3D body: height 0.13, standoff 0, extent 1.692,-0.574 2.378,-0.396
3D body: height 0.25, standoff 0.13, extent 1.019,-0.574 1.756,-0.396
3D body: height 0.25, standoff 0.13, extent 0.968,-0.091 1.705,0.087
3D body: height 0.13, standoff 0, extent 1.641,-0.091 2.327,0.087
3D body: height 0.25, standoff 0.13, extent 1.019,-0.091 1.756,0.087
3D body: height 0.13, standoff 0, extent 1.718,-0.091 2.403,0.087
3D body: height 0.25, standoff 0.13, extent 1.019,0.417 1.756,0.595
3D body: height 0.13, standoff 0, extent 1.692,0.417 2.378,0.595
3D body: height 0.25, standoff 0.13, extent 1.019,0.925 1.756,1.103
3D body: height 0.13, standoff 0, extent 1.692,0.925 2.378,1.103
3D body: height 0.13, standoff 0, extent -2.378,-1.077 -1.692,-0.899
3D body: height 0.25, standoff 0.13, extent -1.756,-1.077 -1.019,-0.899
3D body: height 0.13, standoff 0, extent -2.378,-0.569 -1.692,-0.391
3D body: height 0.25, standoff 0.13, extent -1.756,-0.569 -1.019,-0.391
3D body: height 0.13, standoff 0, extent -2.403,-0.061 -1.718,0.117
3D body: height 0.25, standoff 0.13, extent -1.756,-0.061 -1.019,0.117
3D body: height 0.13, standoff 0, extent -2.327,-0.061 -1.641,0.117
3D body: height 0.25, standoff 0.13, extent -1.705,-0.061 -0.968,0.117
3D body: height 0.25, standoff 0.13, extent -1.756,0.421 -1.019,0.599
3D body: height 0.13, standoff 0, extent -2.378,0.421 -1.692,0.599
3D body: height 0.25, standoff 0.13, extent -1.781,0.929 -1.045,1.107
3D body: height 0.13, standoff 0, extent -2.403,0.929 -1.718,1.107
3D body: height 1.1, standoff 0, extent -1.6,-1.6 1.6,1.6